# Altium footprint library ParsaLibrary.PcbLib: 526 footprints (part 11 of 33)
Each footprint in its own frame and in the unit in brackets; x right, y up, seen from the top. Pads: shape width x height; smd on the part's side, far side on the other; paste and mask are expansions set on the pad; w line width, h text height; cw(c..) or ccw(c..) is an arc to the next point about the centre after c.
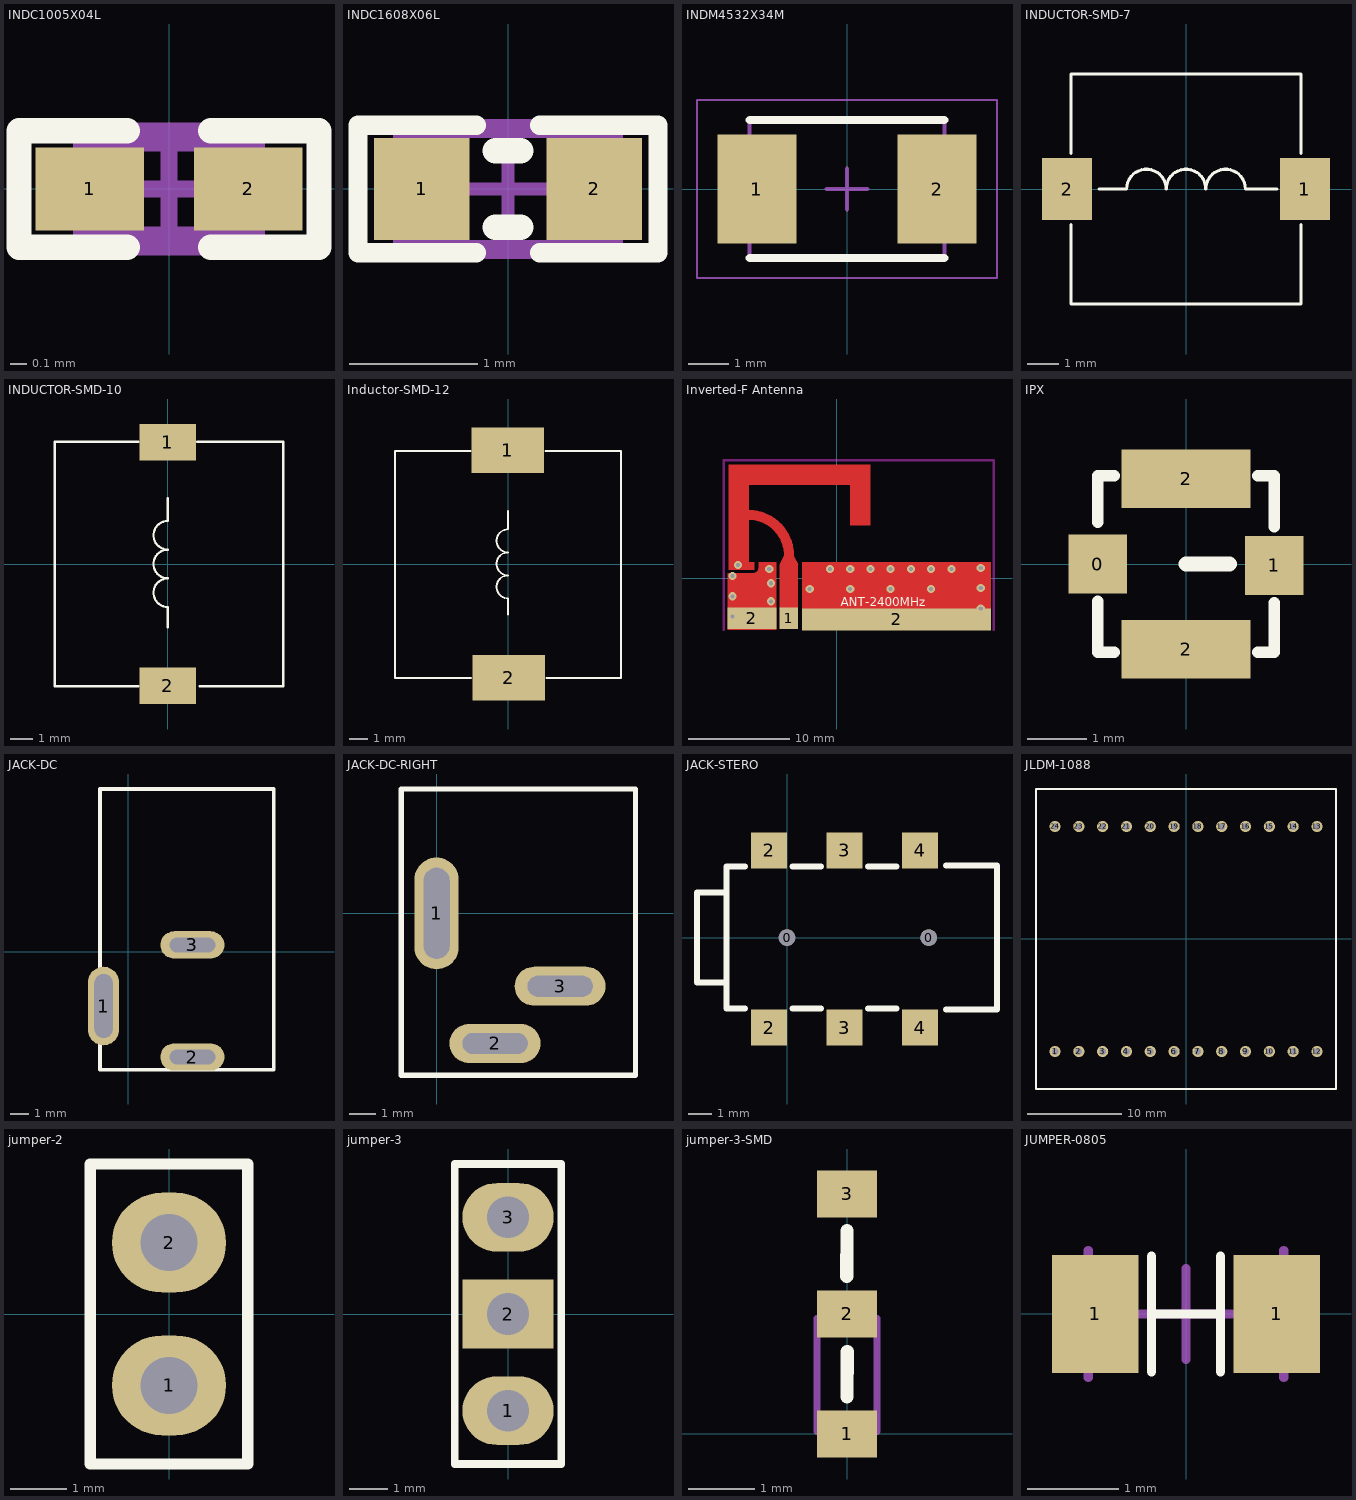
[diagram p10: the footprints below, top view; thin cyan lines are the x and y axes]

## INDC1005X04L [mm] "Chip Inductor, 2-Leads, Body 1.0x0.5mm, IPC High Density"
height 0.4
pads (2):
  rect 0.65x0.5 smd: 1(-0.475,0) 2(0.475,0)
Top Overlay:
  lines w0.152: -0.25,-0.35 -0.9,-0.35 -0.9,0.35 -0.25,0.35 ; 0.25,-0.35 0.9,-0.35 0.9,0.35 0.25,0.35
Mechanical 7:
  lines w0.1: -0.525,-0.275 -0.525,0.275 0.525,0.275 0.525,-0.275 -0.525,-0.275
  text ".Designator" at -0.432,-0.152 h0.3
Mechanical 15:
  lines w0.1: -0.275,0 0.275,0 ; 0,-0.275 0,0.275 ; -0.9,-0.35 -0.9,0.35 0.9,0.35 0.9,-0.35 -0.9,-0.35
3D body "User Library-Chip Inductor 0402.step": height 0.5, standoff 0, extent -0.5,-0.3 0.5,0.3

## INDC1608X06L [mm] "Chip Inductor, 2-Leads, Body 1.6x0.8mm, IPC High Density"
height 0.55
pads (2):
  rect 0.75x0.8 smd: 1(-0.675,0) 2(0.675,0)
Top Overlay:
  lines w0.152: -0.25,-0.5 -1.175,-0.5 -1.175,0.5 -0.25,0.5 ; 0.25,-0.5 1.175,-0.5 1.175,0.5 0.25,0.5
  lines w0.2: -0.1,-0.3 0.1,-0.3 ; -0.1,0.3 0.1,0.3
Mechanical 7:
  lines w0.1: -0.85,-0.45 -0.85,0.45 0.85,0.45 0.85,-0.45 -0.85,-0.45
  text ".Designator" at -0.711,-0.152 h0.3
Mechanical 15:
  lines w0.1: -0.45,0 0.45,0 ; 0,-0.45 0,0.45 ; -1.175,-0.5 1.175,-0.5 1.175,0.5 -1.175,0.5 -1.175,-0.5
3D body "User Library-Chip Inductor.step": height 0.8, standoff 0, extent -0.8,-0.475 0.8,0.475

## INDM4532X34M [mm] "Molded Inductor, 2-Leads, Body 4.50x3.20mm, IPC Low Density"
height 3.4
pads (2):
  rect 1.95x2.7 smd: 1(-2.225,0) 2(2.225,0)
Top Overlay:
  lines w0.2: -2.4,-1.7 2.4,-1.7 ; -2.4,1.7 2.4,1.7
Mechanical 13:
  lines w0.1: -2.4,-1.7 2.4,-1.7 2.4,1.7 -2.4,1.7 -2.4,-1.7
Mechanical 15:
  lines w0.05: -3.7,-2.2 3.7,-2.2 3.7,2.2 -3.7,2.2 -3.7,-2.2
  lines w0.1: -0.5,0 0.5,0 ; 0,-0.5 0,0.5
3D body "INDM4532X34M.step": height 3.4, standoff 0, extent -2.62,-1.7 2.62,1.7

## INDUCTOR-SMD-7 [mm] "7X7"
pads (2):
  rect 1.6x2 smd: 1(3.81,0) 2(-3.81,0)
Top Overlay:
  lines w0.1: -3.683,-1.143 -3.683,-3.683 3.683,-3.683 3.683,-1.143 ; -3.683,1.143 -3.683,3.683 3.683,3.683 3.683,1.143 ; -2.794,0 -1.905,0 cw(c-1.27,0) -0.635,0 cw(c0,0) 0.635,0 cw(c1.27,0) 1.905,0 2.921,0
3D body "CDRN74.stp": height 4.39, standoff -0.11, extent -3.65,-3.65 3.65,3.65

## INDUCTOR-SMD-10 [mm]
pads (2):
  rect 2.5x1.6 smd: 1(0,5.38) 2(0,-5.38)
Top Overlay:
  lines w0.1: -1.3,-5.4 -5,-5.4 -5,5.4 -1.3,5.4 ; 0,-2.794 0,-1.905 cw(c0,-1.27) 0,-0.635 cw(c0,0) 0,0.635 cw(c0,1.27) 0,1.905 0,2.921 ; 1.3,5.4 5.1,5.4 5.1,-5.4 1.4,-5.4
3D body "10x10mm.step": height 3.97, standoff 0.06, extent -5,-5.38 5,5.38

## Inductor-SMD-12 [mm]
pads (2):
  rect 4x2.5 smd: 1(-0.029,6.262) 2(0.029,-6.262)
Top Overlay:
  lines w0.1: -2.062,6.219 -6.239,6.219 -6.239,-6.281 -2.033,-6.281 ; -0.001,-2.787 -0.001,-1.898 cw(c-0.001,-1.263) -0.001,-0.628 cw(c-0.001,0.007) -0.001,0.642 cw(c-0.001,1.277) -0.001,1.912 -0.001,2.928 ; 2.045,6.219 6.224,6.219 6.224,-6.281 2.121,-6.281
3D body "User Library-DR127-1.step": height 8, standoff 0, extent -6.279,-6.238 6.221,6.262

## Inverted-F Antenna [mil]
pads (3):
  rect 72.44x85.04 smd: 1(-186.51,-155)
  rect 190x85.04 smd: 2(-330,-155)
  rect 735.32x85.04 smd: 2(232.65,-160)
via -384.74,52.66 diameter 31.5 hole 15.75
via -255.91,-19.16 diameter 31.5 hole 15.75
via -262.69,36.91 diameter 31.5 hole 15.75
via -404.93,-148.49 diameter 31.5 hole 15.75
via -404.93,-69.75 diameter 31.5 hole 15.75
via -256.25,-89.19 diameter 31.5 hole 15.75
via -404.93,8.99 diameter 31.5 hole 15.75
via 560.14,-116.63 diameter 31.5 hole 15.75
via 367.23,-41.83 diameter 31.5 hole 15.75
via 209.75,-41.83 diameter 31.5 hole 15.75
via 52.27,-41.83 diameter 31.5 hole 15.75
via 560.14,-37.89 diameter 31.5 hole 15.75
via 52.27,36.91 diameter 31.5 hole 15.75
via 560.14,40.85 diameter 31.5 hole 15.75
via 445.97,36.91 diameter 31.5 hole 15.75
via 367.23,36.91 diameter 31.5 hole 15.75
via 288.49,36.91 diameter 31.5 hole 15.75
via 209.75,36.91 diameter 31.5 hole 15.75
via 131.01,36.91 diameter 31.5 hole 15.75
via -26.47,36.91 diameter 31.5 hole 15.75
via -105.21,-41.83 diameter 31.5 hole 15.75
Top Layer:
  region: 52.27,363.69 52.27,442.43 -420.17,442.43 -420.17,363.69
  region: -341.43,64.47 -341.43,363.69 -420.17,363.69 -420.17,64.47
  region: 131.01,206.21 131.01,442.43 52.27,442.43 52.27,206.21
  rectangle: -420.17,33.37 -320.96,64.47
  rectangle: -135,-200 600.3,64.47
  rectangle: -425,-200 -304.9,20
  rectangle: -304.9,-200 -235,64.47
  rectangle: -222.73,-120 -150.29,-49.17
  rectangle: -222.73,-49.17 -150.29,54.98
  region: -222.73,54.98 -205.72,86.48 -166.83,86.48 -150.29,54.98
  lines w10: -330,15 ccw(c-327.5,42.5) -300,40
  lines w39.37: -340.88,246.95 cw(c-343.48,89.49) -186.02,86.9
Top Overlay:
  text "ANT-2400MHz" at 15,-120 h59.06
Keep-Out Layer:
  lines w10: -440,-200 -440,460 610,460 610,-200

## IPX [mm]
pads (4):
  rect 1x1 smd: 0(-1.5,0) 1(1.5,-0.025)
  rect 2.2x1 smd: 2(0,-1.45) 2(0,1.45)
Top Overlay:
  lines w0.2: -1.5,-0.635 -1.5,-1.5 -1.221,-1.5 ; -1.5,0.711 -1.5,1.5 -1.221,1.5 ; 1.221,-1.5 1.5,-1.5 1.5,-0.66 ; 1.221,1.5 1.5,1.5 1.5,0.635
  lines w0.254: 0,0 0.737,0
3D body "SW3dPS-UFL-R-SMD.STEP": height 1.25, standoff 0, extent -1.55,-1.7 1.55,1.7

## JACK-DC [mm]
pads (3):
  oval 1.7x4.3 hole 1 slot 3.5 at 90 deg: 1(-1.339,-2.982)
  oval 3.5x1.5 hole 0.8 slot 2.5 at 0 deg: 2(3.52,-5.77) 3(3.52,0.359)
Top Overlay:
  lines w0.2: -1.532,-6.469 7.965,-6.468 7.965,8.89 -1.532,8.89 -1.532,-6.469
3D body "User Library-PowerJack-2_5x5_7mm.step": height 11, standoff -3.5, extent -1.484,-6.433 7.916,8.767

## JACK-DC-RIGHT [mm]
pads (3):
  oval 1.7x4.3 hole 1 slot 3.5 at 90 deg: 1(0,0.001)
  oval 3.5x1.5 hole 0.8 slot 2.5 at 0 deg: 2(2.25,-5) 3(4.75,-2.8)
Top Overlay:
  lines w0.2: -1.358,-6.219 7.642,-6.219 7.642,4.781 -1.358,4.781 -1.358,-6.219
3D body "User Library-KLDVX-0202-A Kycon.step": height 15, standoff -3.8, extent -1.673,-6.216 7.927,4.784

## JACK-STERO [mil]
pads (8):
  round 27.56 hole 27.56: 0(0,0) 0(236.22,0)
  rect 60x60 smd: 2(-30,-150) 2(-30,145.28) 3(95.98,-150) 3(95.98,145.28) 4(221.97,-150) 4(221.97,145.28)
Top Overlay:
  lines w10: -100.87,-75 -150,-75 -150,75 -100.87,75 ; -70.28,118.11 -100.87,118.11 -100.87,0 -100.87,-118.11 -70,-118.11 ; 9.09,118.11 56.34,118.11 ; 9.37,-118.11 56.61,-118.11 ; 135.08,118.11 182.32,118.11 ; 135.35,-118.11 182.6,-118.11 ; 265,-120 350,-120 350,120 265,120
3D body "User Library-audio_buchse.step": height 160, standoff -0.39, extent -160.63,-145 310.63,143.74

## JLDM-1088 [mm]
pads (24):
  round 1.2 hole 0.7: 1(-13.97,-12) 2(-11.43,-12) 3(-8.89,-12) 4(-6.35,-12) 5(-3.81,-12) 6(-1.27,-12) 7(1.27,-12) 8(3.81,-12) 9(6.35,-12) 10(8.89,-12) 11(11.43,-12) 12(13.97,-12) 13(13.97,12) 14(11.43,12) 15(8.89,12) 16(6.35,12) 17(3.81,12) 18(1.27,12) 19(-1.27,12) 20(-3.81,12) 21(-6.35,12) 22(-8.89,12) 23(-11.43,12) 24(-13.97,12)
Top Overlay:
  lines w0.2: -16,-16 16,-16 16,16 -16,16 -16,-16
3D body: height 6, standoff 0, extent -16,-16 16,16

## jumper-2 [mil]
pads (2):
  oval 80x70 hole 40: 1(0,-50) 2(0,50)
Top Overlay:
  lines w7.87: -55.12,-105.12 55.12,-105.12 55.12,105.12 -55.12,105.12 -55.12,-105.12
3D body "jumper_akspt_g-grey.STEP": height 337.4, standoff 102.36, extent -48.03,-98.03 48.03,98.03
3D body "header02.STEP": height 330, standoff -100, extent -50,-100 50,100

## jumper-3 [mm]
pads (3):
  oval 2.4x1.8 hole 1.1: 1(0,-2.54) 3(0,2.54)
  rect 2.4x1.8 hole 1.1: 2(0,0)
Top Overlay:
  lines w0.2: -1.4,-3.94 -1.4,3.94 1.4,3.94 1.4,-3.94 -1.4,-3.94
3D body "Header3.STEP": height 8.38, standoff -2.54, extent -1.27,-3.785 1.27,3.835
3D body: height 10.16, standoff 3.05, extent -1.27,-3.785 1.27,1.295

## jumper-3-SMD [mm]
pads (3):
  rect 0.9x0.7 smd: 1(0,0) 2(0,1.8) 3(0,3.6)
Top Overlay:
  lines w0.2: -0.006,2.365 0,3.048 ; 0,0.555 0.006,1.238
Mechanical 13:
  lines w0.1: -0.45,0.037 0.45,0.037 0.45,1.737 -0.45,1.737 -0.45,0.037
3D body "0603.STEP": height 0.45, standoff 0, extent -0.381,0.138 0.381,1.662

## JUMPER-0805 [mm]
pads (2):
  rect 0.95x1.3 smd: 1(-1,0) 1(1,0)
Top Overlay:
  lines w0.1: -0.381,-0.635 -0.381,0.635 ; -0.381,0 0.381,0 ; 0.381,-0.635 0.381,0.635
Mechanical 13:
  lines w0.1: -1.075,-0.7 -1.075,0.7 ; 1.075,-0.7 1.075,0.7
Mechanical 15:
  lines w0.1: -0.5,0 0.5,0 ; 0,-0.5 0,0.5
3D body "0805.STEP": height 0.6, standoff 0, extent -1.016,-0.635 1.016,0.635